# Altium footprint library OpenRec.PcbLib: 90 footprints (part 5 of 6)
Each footprint in its own frame and in the unit in brackets; x right, y up, seen from the top. Pads: shape width x height; smd on the part's side, far side on the other; paste and mask are expansions set on the pad; w line width, h text height; cw(c..) or ccw(c..) is an arc to the next point about the centre after c.
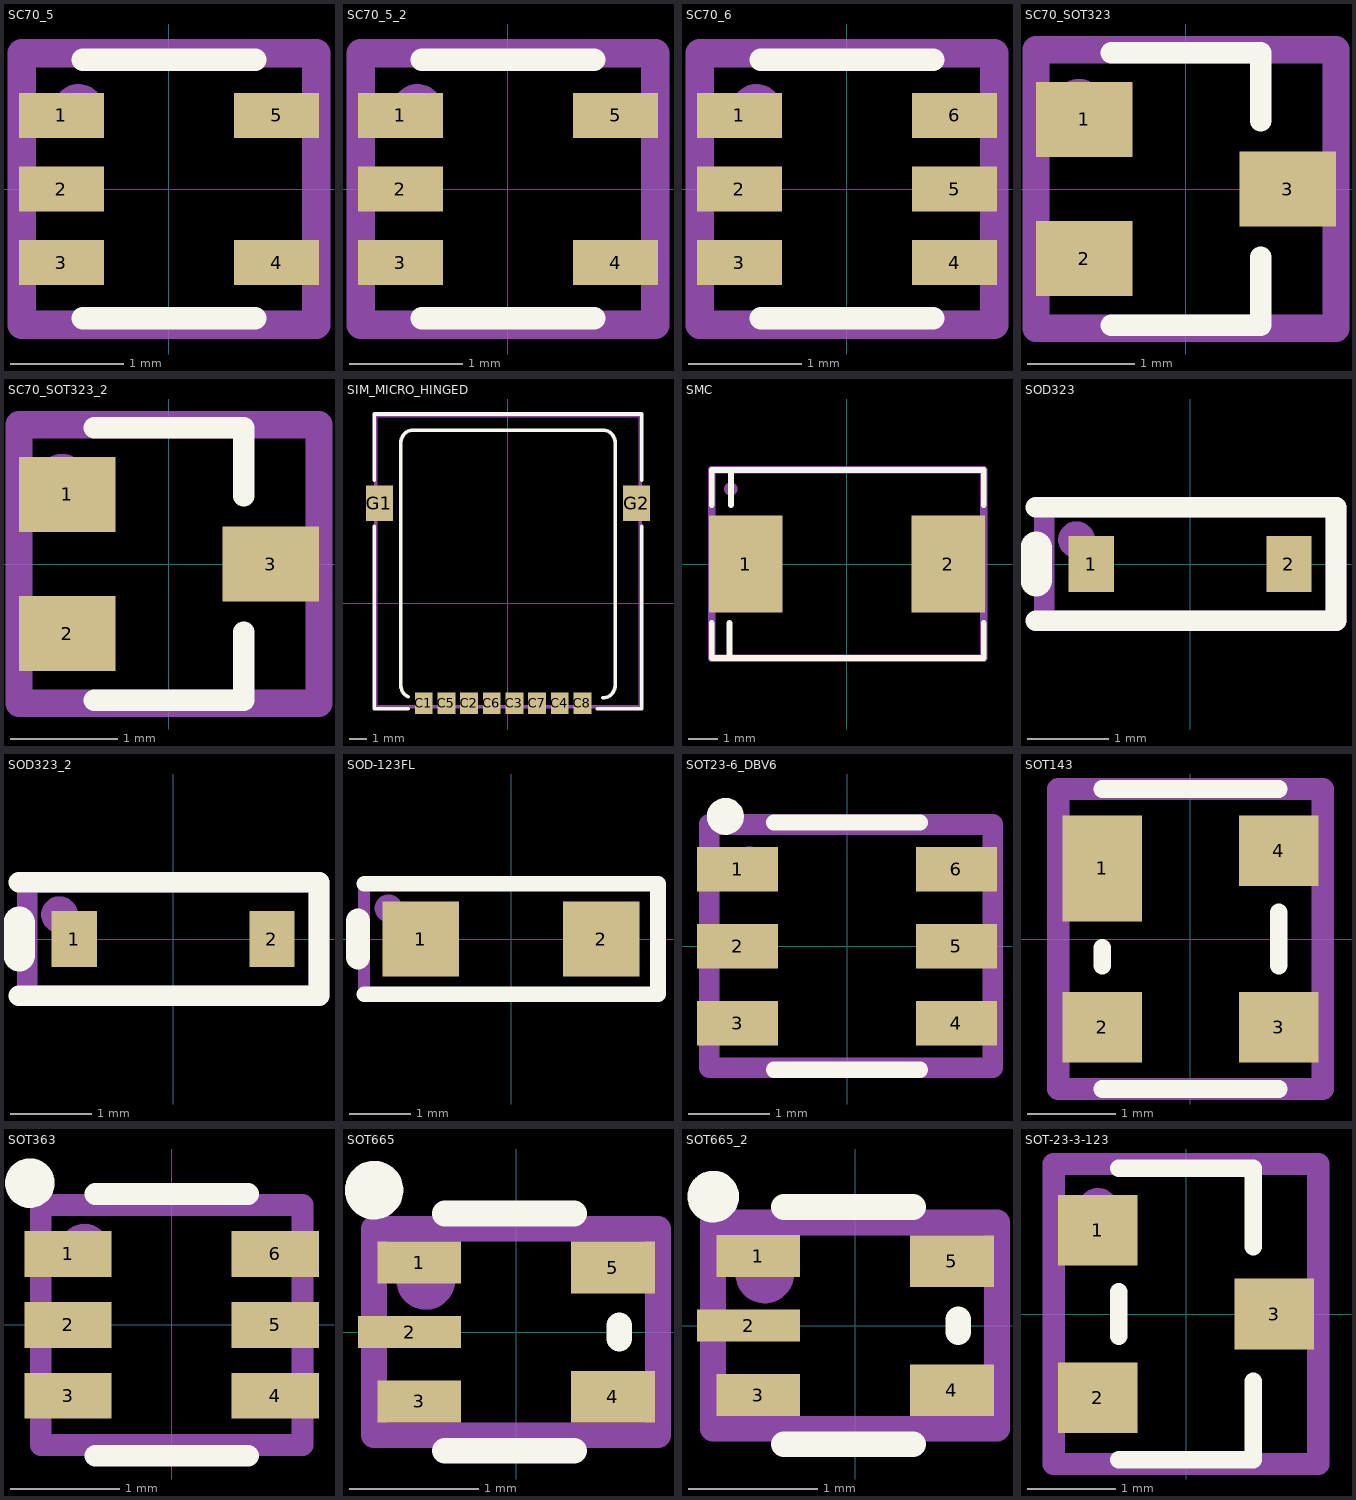
[diagram p4: the footprints below, top view; thin cyan lines are the x and y axes]

## SC70_5 [mm]
pads (5):
  rect 0.75x0.4 smd mask+0.025: 1(-0.95,0.65) 2(-0.95,0) 3(-0.95,-0.65) 4(0.95,-0.65) 5(0.95,0.65)
Top Overlay:
  lines w0.2: -0.762,-1.143 0.762,-1.143 ; -0.762,1.143 0.762,1.143
Mechanical 29:
  circle w0.254: c-0.8,0.7 r0.1
  lines w0.254: -1.3,-1.2 1.3,-1.2 1.3,1.2 -1.3,1.2 -1.3,-1.2
  text ".Designator" at 0.3,-0.5 h0.6
3D body: height 1.1, standoff 0, extent -0.762,-1.143 0.762,1.143
3D body: height 0.8, standoff 0, extent -1.206,0.445 -0.762,0.826
3D body: height 0.8, standoff 0, extent -1.206,-0.191 -0.762,0.191
3D body: height 0.8, standoff 0, extent -1.206,-0.826 -0.762,-0.445
3D body: height 0.8, standoff 0, extent 0.762,-0.826 1.206,-0.445
3D body: height 0.8, standoff 0, extent 0.762,0.445 1.206,0.826

## SC70_5_2 [mm]
pads (5):
  rect 0.75x0.4 smd mask+0.025: 1(-0.95,0.65) 2(-0.95,0) 3(-0.95,-0.65) 4(0.95,-0.65) 5(0.95,0.65)
Top Overlay:
  lines w0.2: -0.762,-1.143 0.762,-1.143 ; -0.762,1.143 0.762,1.143
Mechanical 29:
  circle w0.254: c-0.8,0.7 r0.1
  lines w0.254: -1.3,-1.2 1.3,-1.2 1.3,1.2 -1.3,1.2 -1.3,-1.2
  text ".Designator" at 0.8,0.3 h0.6
3D body: height 1.1, standoff 0, extent -0.762,-1.143 0.762,1.143
3D body: height 0.8, standoff 0, extent -1.206,0.445 -0.762,0.826
3D body: height 0.8, standoff 0, extent -1.206,-0.191 -0.762,0.191
3D body: height 0.8, standoff 0, extent -1.206,-0.826 -0.762,-0.445
3D body: height 0.8, standoff 0, extent 0.762,-0.826 1.206,-0.445
3D body: height 0.8, standoff 0, extent 0.762,0.445 1.206,0.826

## SC70_6 [mm]
pads (6):
  rect 0.75x0.4 smd mask+0.025: 1(-0.95,0.65) 2(-0.95,0) 3(-0.95,-0.65) 4(0.95,-0.65) 5(0.95,0) 6(0.95,0.65)
Top Overlay:
  lines w0.2: -0.762,-1.143 0.762,-1.143 ; -0.762,1.143 0.762,1.143
Mechanical 29:
  circle w0.254: c-0.8,0.7 r0.1
  lines w0.254: -1.3,-1.2 1.3,-1.2 1.3,1.2 -1.3,1.2 -1.3,-1.2
  text ".Designator" at -0.8,-0.3 h0.6
3D body: height 1.1, standoff 0, extent -0.762,-1.143 0.762,1.143
3D body: height 0.8, standoff 0, extent -1.206,0.445 -0.762,0.826
3D body: height 0.8, standoff 0, extent -1.206,-0.191 -0.762,0.191
3D body: height 0.8, standoff 0, extent -1.206,-0.826 -0.762,-0.445
3D body: height 0.8, standoff 0, extent 0.762,-0.826 1.206,-0.445
3D body: height 0.8, standoff 0, extent 0.762,0.445 1.206,0.826
3D body: height 0.8, standoff 0, extent 0.778,-0.19 1.222,0.191

## SC70_SOT323 [mm]
pads (3):
  rect 0.9x0.7 smd: 1(-0.95,0.65) 2(-0.95,-0.65) 3(0.95,0)
Top Overlay:
  lines w0.2: -0.699,-1.27 0.699,-1.27 0.699,-0.635 ; -0.699,1.27 0.699,1.27 0.699,0.635
Mechanical 29:
  circle w0.254: c-1,0.8 r0.1
  lines w0.254: -1.4,-1.3 -1.4,1.3 1.4,1.3 1.4,-1.3 -1.4,-1.3
  text ".Designator" at 0.4,-0.5 h0.6
3D body: height 0.75, standoff 0, extent 0.699,-0.318 1.27,0.381
3D body: height 0.75, standoff 0, extent -1.27,-1.016 -0.699,-0.318
3D body: height 0.75, standoff 0, extent -1.27,0.318 -0.699,1.016
3D body: height 1.1, standoff 0, extent -0.699,-1.27 0.699,1.27

## SC70_SOT323_2 [mm]
pads (3):
  rect 0.9x0.7 smd: 1(-0.95,0.65) 2(-0.95,-0.65) 3(0.95,0)
Top Overlay:
  lines w0.2: -0.699,-1.27 0.699,-1.27 0.699,-0.635 ; -0.699,1.27 0.699,1.27 0.699,0.635
Mechanical 29:
  circle w0.254: c-1,0.8 r0.1
  lines w0.254: -1.4,-1.3 -1.4,1.3 1.4,1.3 1.4,-1.3 -1.4,-1.3
  text ".Designator" at -0.5,-0.3 h0.6
3D body: height 0.75, standoff 0, extent 0.699,-0.318 1.27,0.381
3D body: height 0.75, standoff 0, extent -1.27,-1.016 -0.699,-0.318
3D body: height 0.75, standoff 0, extent -1.27,0.318 -0.699,1.016
3D body: height 1.1, standoff 0, extent -0.699,-1.27 0.699,1.27

## SIM_MICRO_HINGED [mm]
pads (10):
  rect 1x1.2 smd mask+0.06: C1(-4.72,-5.6) C2(-2.18,-5.6) C3(0.36,-5.6) C4(2.9,-5.6) C5(-3.45,-5.6) C6(-0.91,-5.6) C7(1.63,-5.6) C8(4.17,-5.6)
  rect 1.5x2 smd: G1(-7.2,5.6) G2(7.2,5.6)
Top Overlay:
  lines w0.2: -7.5,4.3 -7.5,-5.9 -5.6,-5.9 ; -7.5,6.9 -7.5,10.6 7.5,10.6 7.5,6.9 ; -5.576,-5.243 cw(c-5.3,-4.6) -6,-4.6 -6,9 cw(c-5.3,9) -5.3,9.7 5.3,9.7 cw(c5.3,9) 6,9 6,-4.6 cw(c5.3,-4.6) 5.3,-5.3 ; 5,-5.9 7.5,-5.9 7.5,4.3
Mechanical 29:
  lines w0.2: -7.4,-5.8 -7.4,10.5 7.4,10.5 7.4,-5.8 -7.4,-5.8
  text ".Designator" at -2.7,1.5 h2
3D body "693022010811.stp": height 1.87, standoff -0.08, extent -7.7,-5.8 7.7,10.5

## SMC [mm]
pads (2):
  rect 2.5x3.3 smd: 1(-3.45,0) 2(3.45,0)
Top Overlay:
  lines w0.2: -4.6,-2 -4.6,-3.2 4.65,-3.2 4.65,-2 ; -4.6,2 -4.6,3.2 4.65,3.2 4.65,2 ; -4,-3.2 -4,-2 ; -3.95,2 -3.95,3.2
Mechanical 29:
  circle w0.254: c-3.95,2.55 r0.1
  lines w0.254: -4.6,-3.2 4.65,-3.2 4.65,3.2 -4.6,3.2 -4.6,-3.2
  text ".Designator" at 1.5,0.8 h1.52
3D body "DO-214AB SMC.step": height 2.3, standoff 0, extent -3.975,-2.95 3.975,2.95

## SOD323 [mil]
pads (2):
  rect 22x27 smd mask+3: 1(-48,0) 2(48,0)
Top Overlay:
  lines w10: -74.8,-27.56 70.87,-27.56 70.87,27.56 -74.8,27.56
  lines w15.75: -74.8,-7.87 -74.8,7.87
Mechanical 29:
  circle w10: c-55.12,11.81 r3.94
  lines w10: -70.87,-27.56 70.87,-27.56 70.87,27.56 -70.87,27.56 -70.87,-27.56
  text ".Designator" at 19.69,7.87 h15.75
3D body "SOD323.step": height 38.78, standoff -0.2, extent -49.21,-24.6 49.21,24.61

## SOD323_2 [mil]
pads (2):
  rect 22x27 smd mask+3: 1(-48,0) 2(48,0)
Top Overlay:
  lines w10: -74.8,-27.56 70.87,-27.56 70.87,27.56 -74.8,27.56
  lines w15.75: -74.8,-7.87 -74.8,7.87
Mechanical 29:
  circle w10: c-55.12,11.81 r3.94
  lines w10: -70.87,-27.56 70.87,-27.56 70.87,27.56 -70.87,27.56 -70.87,-27.56
  text ".Designator" at -15.75,-7.87 h15.75
3D body "SOD323.step": height 38.78, standoff -0.2, extent -49.21,-24.61 49.21,24.6

## SOD-123FL [mm]
pads (2):
  rect 1.25x1.22 smd: 1(-1.475,0) 2(1.475,0)
Top Overlay:
  lines w0.254: -2.4,-0.9 2.4,-0.9 2.4,0.9 -2.4,0.9
  lines w0.4: -2.5,-0.3 -2.5,0.3
Mechanical 29:
  circle w0.254: c-2,0.5 r0.1
  lines w0.2: -2.4,-0.9 2.4,-0.9 2.4,0.9 -2.4,0.9 -2.4,-0.9
  text ".Designator" at 0.9,0.3 h0.6
3D body "SOD-123FL CASE 498.step": height 0.95, standoff 0, extent -1.8,-0.825 1.8,0.825

## SOT23-6_DBV6 [mm]
pads (6):
  rect 1x0.55 smd: 1(-1.35,0.95) 2(-1.35,0) 3(-1.35,-0.95) 4(1.35,-0.95) 5(1.35,0) 6(1.35,0.95)
Top Overlay:
  circle w0.254: c-1.5,1.6 r0.1
  lines w0.2: -0.9,-1.525 0.9,-1.525 ; -0.9,1.525 0.9,1.525
Mechanical 29:
  circle w0.254: c-1.2,1 r0.1
  lines w0.254: -1.7,-1.5 1.8,-1.5 1.8,1.5 -1.7,1.5 -1.7,-1.5
  text ".Designator" at 0.2,-0.8 h0.6
3D body: height 1.45, standoff 0, extent -1,-1.5 1,1.5
3D body: height 0.7, standoff 0, extent -1.5,0.7 -1,1.2
3D body: height 0.7, standoff 0, extent -1.5,-1.2 -1,-0.7
3D body: height 0.7, standoff 0, extent 1,0.7 1.5,1.2
3D body: height 0.7, standoff 0, extent 1,-1.2 1.5,-0.7
3D body: height 0.7, standoff 0, extent -1.5,-0.3 -1,0.3
3D body: height 0.7, standoff 0, extent 1,-0.3 1.5,0.3

## SOT143 [mm]
pads (4):
  rect 0.9x1.2 smd: 1(-1,0.8)
  rect 0.9x0.8 smd: 2(-1,-1) 3(1,-1) 4(1,1)
Top Overlay:
  lines w0.2: -1,-1.7 1,-1.7 ; -1,-0.3 -1,-0.1 ; -1,1.7 1,1.7 ; 1,-0.3 1,0.3
Mechanical 29:
  circle w0.254: c-1,1.1 r0.1
  lines w0.254: -1.5,-1.7 1.5,-1.7 1.5,1.7 -1.5,1.7 -1.5,-1.7
  text ".Designator" at 1,0.4 h0.8
3D body: height 1, standoff 0, extent -1,-1.7 1,1.7

## SOT363 [mm]
pads (6):
  rect 0.8x0.42 smd mask+0.06: 1(-0.95,0.65) 2(-0.95,0) 3(-0.95,-0.65) 4(0.95,-0.65) 5(0.95,0) 6(0.95,0.65)
Top Overlay:
  circle w0.254: c-1.3,1.3 r0.1
  lines w0.2: -0.7,-1.2 0.7,-1.2 ; -0.7,1.2 0.7,1.2
Mechanical 29:
  circle w0.254: c-0.8,0.7 r0.1
  lines w0.2: -1.2,-1.1 1.2,-1.1 1.2,1.1 -1.2,1.1 -1.2,-1.1
  text ".Designator" at 0.5,0.3 h0.6
3D body "SOT363-2.step": height 1.1, standoff 0, extent -1.2,-1.1 1.2,1.1

## SOT665 [mm]
pads (5):
  rect 0.65x0.325 smd mask+0.05: 1(-0.75,0.538) 3(-0.75,-0.538)
  rect 0.8x0.25 smd mask+0.05: 2(-0.825,0)
  rect 0.65x0.4 smd mask+0.05: 4(0.75,-0.5) 5(0.75,0.5)
Top Overlay:
  circle w0.254: c-1.1,1.1 r0.1
  lines w0.2: -0.55,-0.92 0.45,-0.92 ; -0.55,0.92 0.45,0.92 ; 0.8,-0.05 0.8,0.05
Mechanical 29:
  circle w0.254: c-0.7,0.4 r0.1
  lines w0.2: -1.1,-0.8 1.1,-0.8 1.1,0.8 -1.1,0.8 -1.1,-0.8
  text ".Designator" at -0.4,-0.3 h0.4
3D body "SOT50P160X60-5.step": height 0.6, standoff 0, extent -0.8,-0.795 0.8,0.795

## SOT665_2 [mm]
pads (5):
  rect 0.65x0.325 smd mask+0.05: 1(-0.75,0.538) 3(-0.75,-0.538)
  rect 0.8x0.25 smd mask+0.05: 2(-0.825,0)
  rect 0.65x0.4 smd mask+0.05: 4(0.75,-0.5) 5(0.75,0.5)
Top Overlay:
  circle w0.2: c-1.1,1 r0.1
  lines w0.2: -0.55,-0.92 0.45,-0.92 ; -0.55,0.92 0.45,0.92 ; 0.8,-0.05 0.8,0.05
Mechanical 29:
  circle w0.254: c-0.7,0.4 r0.1
  lines w0.2: -1.1,-0.8 1.1,-0.8 1.1,0.8 -1.1,0.8 -1.1,-0.8
  text ".Designator" at 0.5,0.2 h0.4
3D body "SOT50P160X60-5.step": height 0.6, standoff 0, extent -0.8,-0.796 0.8,0.795

## SOT-23-3-123 [mm]
pads (3):
  rect 0.9x0.8 smd: 1(-1,0.95) 2(-1,-0.95) 3(1,0)
Top Overlay:
  lines w0.2: -0.762,-1.651 0.762,-1.651 0.762,-0.762 ; -0.762,-0.254 -0.762,0.254 ; -0.762,1.651 0.762,1.651 0.762,0.762
Mechanical 29:
  circle w0.254: c-1,1.2 r0.1
  lines w0.254: -1.5,-1.7 -1.5,1.7 1.5,1.7 1.5,-1.7 -1.5,-1.7
  text ".Designator" at -0.4,-0.3 h0.6
3D body: height 0.5, standoff 0, extent 0.762,-0.381 1.27,0.381
3D body: height 0.5, standoff 0, extent -1.27,-1.333 -0.762,-0.572
3D body: height 0.5, standoff 0, extent -1.27,0.572 -0.762,1.333
3D body: height 1.1, standoff 0, extent -0.762,-1.651 0.762,1.651